# Altium footprint library hphonglib.PcbLib: 1250 footprints (part 17 of 79)
Each footprint in its own frame and in the unit in brackets; x right, y up, seen from the top. Pads: shape width x height; smd on the part's side, far side on the other; paste and mask are expansions set on the pad; w line width, h text height; cw(c..) or ccw(c..) is an arc to the next point about the centre after c.
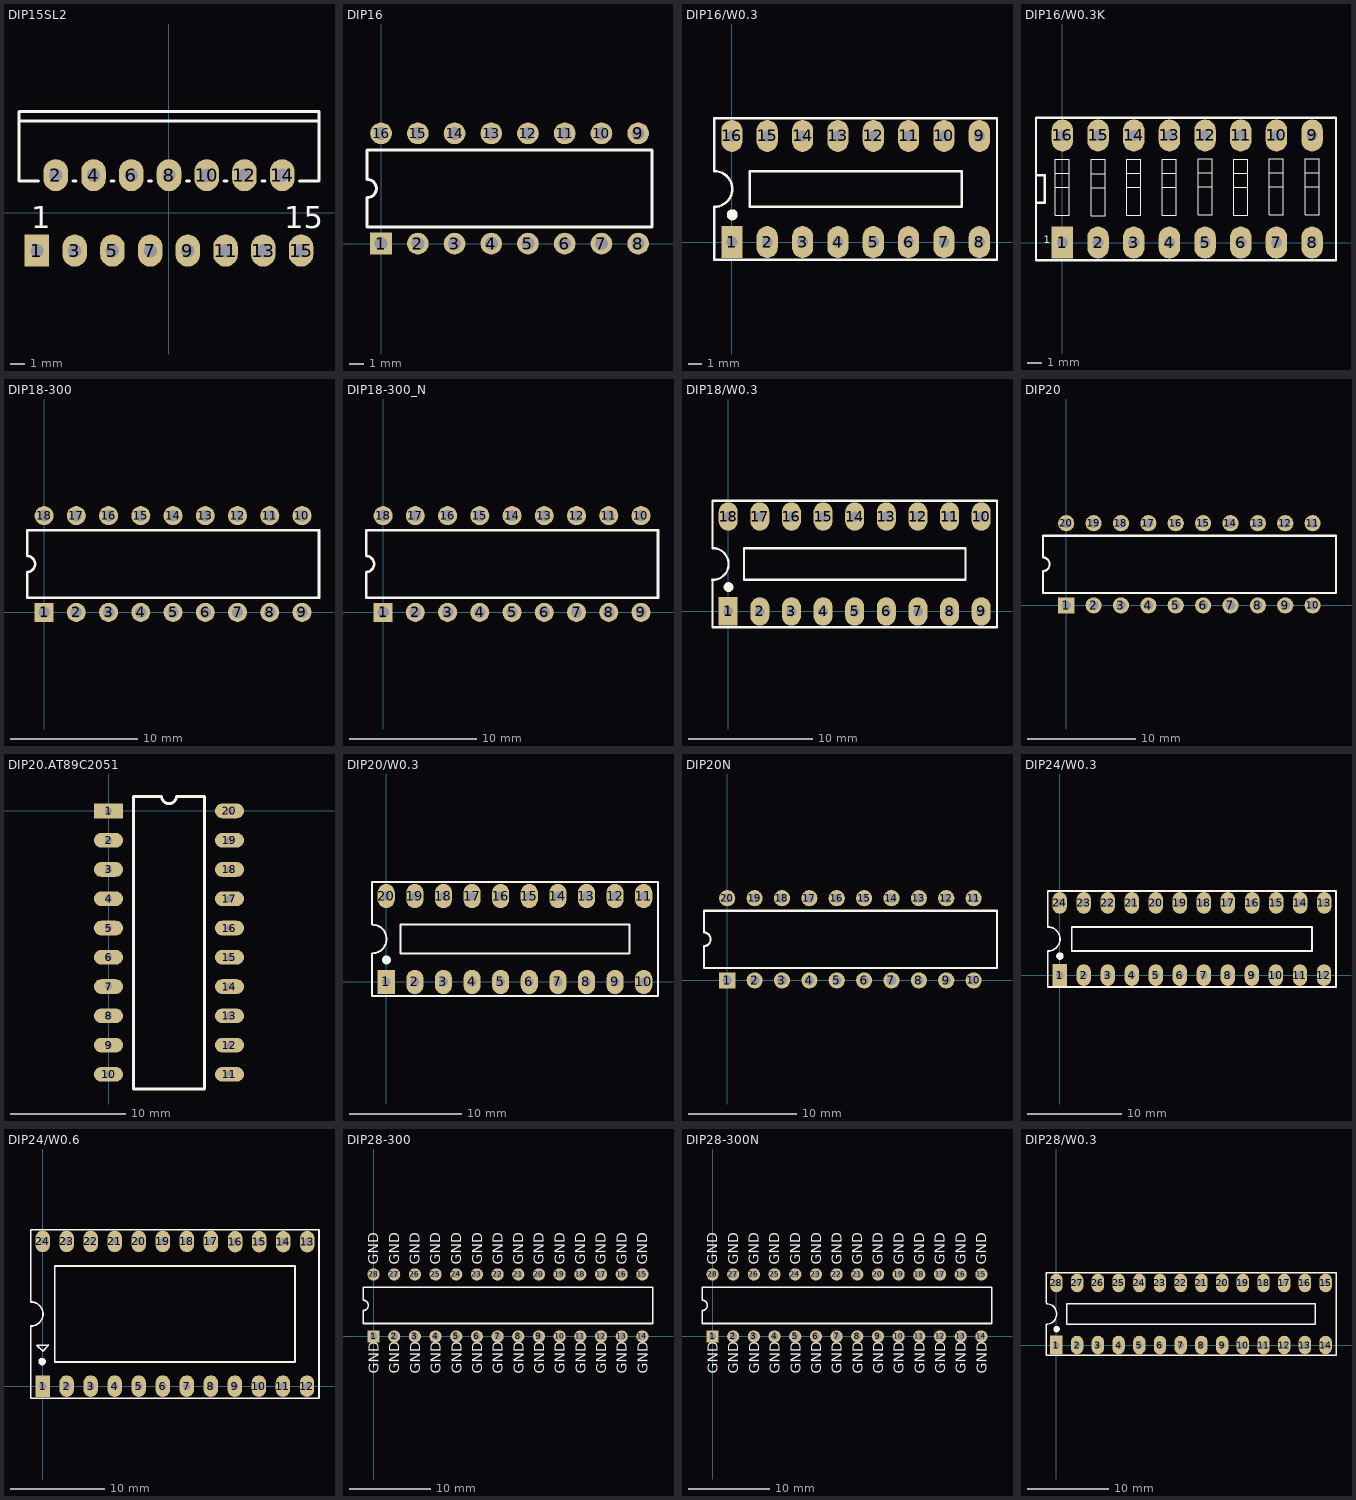
[diagram p16: the footprints below, top view; thin cyan lines are the x and y axes]

## DIP15SL2 [mil] "TO, Thru-Hole, Vertical, Heatsink Mounted; 15 Bent Staggered Leads; Pitch 1.27 mm"
height 826.77
pads (15):
  rect 65x85 hole 35.43: 1(-350,-100)
  oval 65x85 hole 35.43: 2(-300,100) 3(-250,-100) 4(-200,100) 5(-150,-100) 6(-100,100) 7(-50,-100) 8(0,100) 9(50,-100) 10(100,100) 11(150,-100) 12(200,100) 13(250,-100) 14(300,100) 15(350,-100)
Top Overlay:
  lines w7.87: -397.64,243.7 397.64,243.7 ; -346.46,84.25 -397.64,84.25 -397.64,269.29 397.64,269.29 397.64,84.25 346.46,84.25 ; -253.94,84.25 -246.06,84.25 ; -153.94,84.25 -146.06,84.25 ; -53.94,84.25 -46.06,84.25 ; 46.06,84.25 53.94,84.25 ; 146.06,84.25 153.94,84.25 ; 246.06,84.25 253.94,84.25
  text "15" at 305,-40 h59.06
  text "1" at -365,-40 h59.06
3D body "User Library-MULTIWAT T15.step": height 895.25, standoff -85.66, extent -381.82,-109.82 389.84,247.19

## DIP16 [mm] "DIP; 16 Leads; Row Spacing 7.62 mm; Pitch 2.54 mm"
height 4.58
pads (16):
  rect 1.5x1.5 hole 0.9: 1(0,0)
  round 1.5 hole 0.9: 2(2.54,0) 3(5.08,0) 4(7.62,0) 5(10.16,0) 6(12.7,0) 7(15.24,0) 8(17.78,0) 9(17.78,7.62) 10(15.24,7.62) 11(12.7,7.62) 12(10.16,7.62) 13(7.62,7.62) 14(5.08,7.62) 15(2.54,7.62) 16(0,7.62)
Top Overlay:
  lines w0.2: -0.96,1.16 -0.96,3.175 ccw(c-0.96,3.81) -0.96,4.445 -0.96,6.46 18.74,6.46 18.74,1.16 -0.96,1.16
Bottom Overlay:
  lines w0.254: -1.35,-1.175 -1.35,8.725 19.15,8.725 19.15,-1.175 -1.35,-1.175
3D body "DIP16-300.STEP": height 5.08, standoff -2.49, extent -1.15,-0.145 18.85,7.725

## DIP16/W0.3 [mil] "16 PIN, W 300mil, Pin to pin 100mil"
height 100
pads (16):
  rect 60x90 hole 31: 1(0,0)
  oval 60x90 hole 31: 2(100,0) 3(200,0) 4(300,0) 5(400,0) 6(500,0) 7(600,0) 8(700,0) 9(700,300) 10(600,300) 11(500,300) 12(400,300) 13(300,300) 14(200,300) 15(100,300) 16(0,300)
Top Overlay:
  circle w15: c1,77 r8
  lines w7: -50.38,100.05 ccw(c-48.69,150.02) -50,200 ; -50,100 -50,-50 750,-50 750,350 -49,350 -50,349 ; -50,201 -50,350 ; 50,100 650,100 650,200 50,200 50,100
3D body "SW3dPS-DIP 16 _ socket 214.STEP": height 299.42, standoff -131.12, extent -51.7,-57.39 751.7,356

## DIP16/W0.3K [mil] "16 PIN, W 300mil, Pin to pin 100mil For Switch"
height 100
pads (16):
  rect 60x90 hole 31.5: 1(0,0)
  oval 60x90 hole 31.5: 2(100,0) 3(200,0) 4(300,0) 5(400,0) 6(500,0) 7(600,0) 8(700,0) 9(700,300) 10(600,300) 11(500,300) 12(400,300) 13(300,300) 14(200,300) 15(100,300) 16(0,300)
Top Overlay:
  lines w1.5: -19.68,155 19.68,155 ; -19.68,194.37 19.68,194.37 ; 80.31,154 119.69,154 ; 80.31,193.37 119.69,193.37 ; 180.31,155 219.69,155 ; 180.31,194.37 219.69,194.37 ; 280.31,155 319.69,155 ; 280.31,194.37 319.69,194.37 ; 380.31,156 419.69,156 ; 380.31,195.37 419.69,195.37 ; 480.31,155 519.68,155 ; 480.31,194.37 519.68,194.37 ; 580.32,156 619.68,156 ; 580.32,195.37 619.68,195.37 ; 680.32,156 719.68,156 ; 680.32,195.37 719.68,195.37 ; -19.68,76.26 19.68,76.26 19.68,233.74 -19.68,233.74 -19.68,76.26 ; 80.31,75.26 119.69,75.26 119.69,232.74 80.31,232.74 80.31,75.26 ; 180.31,76.26 219.69,76.26 219.69,233.74 180.31,233.74 180.31,76.26 ; 280.31,76.26 319.69,76.26 319.69,233.74 280.31,233.74 280.31,76.26 ; 380.31,77.26 419.69,77.26 419.69,234.74 380.31,234.74 380.31,77.26 ; 480.31,76.26 519.68,76.26 519.68,233.74 480.31,233.74 480.31,76.26 ; 580.32,77.26 619.68,77.26 619.68,234.74 580.32,234.74 580.32,77.26 ; 680.32,77.26 719.68,77.26 719.68,234.74 680.32,234.74 680.32,77.26
  lines w7: -74,69.5 -74,234 ; -74,111 -49,111 -49,189 -73,189 -74,190 ; -74,125 -74,-49 -73,-50 767,-50 767,350 -74,350 -74,175
  text "1" at -52,-2 h20
3D body "SW3dPS-DIP SWITCH 8 POS CTS 206.STEP": height 324.8, standoff -137.8, extent -92.91,-40 792.91,345.04

## DIP18-300 [mm] "DIP, Plastic; 18 Leads; Row Spacing 7.62 mm; Pitch 2.54 mm"
height 4.32
pads (18):
  rect 1.5x1.5 hole 0.9: 1(0,0)
  round 1.5 hole 0.9: 2(2.54,0) 3(5.08,0) 4(7.62,0) 5(10.16,0) 6(12.7,0) 7(15.24,0) 8(17.78,0) 9(20.32,0) 10(20.32,7.62) 11(17.78,7.62) 12(15.24,7.62) 13(12.7,7.62) 14(10.16,7.62) 15(7.62,7.62) 16(5.08,7.62) 17(2.54,7.62) 18(0,7.62)
Top Overlay:
  lines w0.2: -1.34,1.16 21.66,1.16 21.66,6.46 -1.34,6.46 -1.34,4.445 cw(c-1.34,3.81) -1.34,3.175 -1.34,1.16

## DIP18-300_N [mm] "DIP, Plastic; 18 Leads; Row Spacing 7.62 mm; Pitch 2.54 mm"
height 4.32
pads (18):
  rect 1.5x1.5 hole 0.9: 1(0,0)
  round 1.5 hole 0.9: 2(2.54,0) 3(5.08,0) 4(7.62,0) 5(10.16,0) 6(12.7,0) 7(15.24,0) 8(17.78,0) 9(20.32,0) 10(20.32,7.62) 11(17.78,7.62) 12(15.24,7.62) 13(12.7,7.62) 14(10.16,7.62) 15(7.62,7.62) 16(5.08,7.62) 17(2.54,7.62) 18(0,7.62)
Top Overlay:
  lines w0.2: -1.34,1.16 -1.34,3.175 ccw(c-1.34,3.81) -1.34,4.445 -1.34,6.46 21.66,6.46 21.66,1.16 -1.34,1.16

## DIP18/W0.3 [mil] "18 PIN, W 300mil, Pin to pin 100mil"
height 100
pads (18):
  rect 60x90 hole 31: 1(0,0)
  oval 60x90 hole 31: 2(100,0) 3(200,0) 4(300,0) 5(400,0) 6(500,0) 7(600,0) 8(700,0) 9(800,0) 10(800,300) 11(700,300) 12(600,300) 13(500,300) 14(400,300) 15(300,300) 16(200,300) 17(100,300) 18(0,300)
Top Overlay:
  circle w15: c1,77 r8
  lines w7: -50.38,100.05 ccw(c-48.69,150.02) -50,200 ; -50,100 -50,-50 850,-50 850,350 -50,350 -50,201 ; 50,100 750,100 750,200 50,200 50,100
3D body "SW3dPS-DIP18.STEP": height 118.71, standoff -131.12, extent -51.18,-57.39 849.18,356

## DIP20 [mm] "DIP; 20 Leads; Row Spacing 7.62 mm; Pitch 2.54 mm"
height 4.58
pads (20):
  rect 1.5x1.5 hole 0.9: 1(0,0)
  round 1.5 hole 0.9: 2(2.54,0) 3(5.08,0) 4(7.62,0) 5(10.16,0) 6(12.7,0) 7(15.24,0) 8(17.78,0) 9(20.32,0) 10(22.86,0) 11(22.86,7.62) 12(20.32,7.62) 13(17.78,7.62) 14(15.24,7.62) 15(12.7,7.62) 16(10.16,7.62) 17(7.62,7.62) 18(5.08,7.62) 19(2.54,7.62) 20(0,7.62)
Top Overlay:
  lines w0.2: -2.17,1.16 -2.17,3.175 ccw(c-2.17,3.81) -2.17,4.445 -2.17,6.46 25.03,6.46 25.03,1.16 -2.17,1.16
Bottom Overlay:
  lines w0.254: -1.3,-1.15 24.2,-1.15 24.2,8.825 -1.3,8.825 -1.3,-1.15
3D body: height 0.5, standoff -3.8, extent -0.26,-0.195 0.29,0.155
3D body: height 3, standoff 0.5, extent -0.735,-0.195 0.765,0.155
3D body: height 3, standoff 2.65, extent -0.735,-0.02 0.765,1.68
3D body: height 0.5, standoff -3.8, extent 2.28,-0.195 2.83,0.155
3D body: height 3, standoff 0.5, extent 1.805,-0.195 3.305,0.155
3D body: height 3, standoff 2.65, extent 1.805,-0.02 3.305,1.68
3D body: height 0.5, standoff -3.8, extent 4.82,-0.195 5.37,0.155
3D body: height 3, standoff 0.5, extent 4.345,-0.195 5.845,0.155
3D body: height 3, standoff 2.65, extent 4.345,-0.02 5.845,1.68
3D body: height 0.5, standoff -3.8, extent 7.36,-0.195 7.91,0.155
3D body: height 3, standoff 0.5, extent 6.885,-0.195 8.385,0.155
3D body: height 3, standoff 2.65, extent 6.885,-0.02 8.385,1.68
3D body: height 0.5, standoff -3.8, extent 9.9,-0.195 10.45,0.155
3D body: height 3, standoff 0.5, extent 9.425,-0.195 10.925,0.155
3D body: height 3, standoff 2.65, extent 9.425,-0.02 10.925,1.68
3D body: height 0.5, standoff -3.8, extent 12.44,-0.195 12.99,0.155
3D body: height 3, standoff 0.5, extent 11.965,-0.195 13.465,0.155
3D body: height 3, standoff 2.65, extent 11.965,-0.02 13.465,1.68
3D body: height 0.5, standoff -3.8, extent 14.98,-0.195 15.53,0.155
3D body: height 3, standoff 0.5, extent 14.505,-0.195 16.005,0.155
3D body: height 3, standoff 2.65, extent 14.505,-0.02 16.005,1.68
3D body: height 0.5, standoff -3.8, extent 17.52,-0.195 18.07,0.155
3D body: height 3, standoff 0.5, extent 17.045,-0.195 18.545,0.155
3D body: height 3, standoff 2.65, extent 17.045,-0.02 18.545,1.68
3D body: height 0.5, standoff -3.8, extent 20.06,-0.195 20.61,0.155
3D body: height 3, standoff 0.5, extent 19.585,-0.195 21.085,0.155
3D body: height 3, standoff 2.65, extent 19.585,-0.02 21.085,1.68
3D body: height 0.5, standoff -3.8, extent 22.6,-0.195 23.15,0.155
3D body: height 3, standoff 0.5, extent 22.125,-0.195 23.625,0.155
3D body: height 3, standoff 2.65, extent 22.125,-0.02 23.625,1.68
3D body: height 3, standoff 2.65, extent -0.765,5.94 0.735,7.64
3D body: height 3, standoff 0.5, extent -0.765,7.465 0.735,7.815
3D body: height 0.5, standoff -3.8, extent -0.29,7.465 0.26,7.815
3D body: height 3, standoff 2.65, extent 1.775,5.94 3.275,7.64
3D body: height 3, standoff 0.5, extent 1.775,7.465 3.275,7.815
3D body: height 0.5, standoff -3.8, extent 2.25,7.465 2.8,7.815
3D body: height 3, standoff 2.65, extent 4.315,5.94 5.815,7.64
3D body: height 3, standoff 0.5, extent 4.315,7.465 5.815,7.815
3D body: height 0.5, standoff -3.8, extent 4.79,7.465 5.34,7.815
3D body: height 3, standoff 2.65, extent 6.855,5.94 8.355,7.64
3D body: height 3, standoff 0.5, extent 6.855,7.465 8.355,7.815
3D body: height 0.5, standoff -3.8, extent 7.33,7.465 7.88,7.815
3D body: height 3, standoff 2.65, extent 9.395,5.94 10.895,7.64
3D body: height 3, standoff 0.5, extent 9.395,7.465 10.895,7.815
3D body: height 0.5, standoff -3.8, extent 9.87,7.465 10.42,7.815
3D body: height 3, standoff 2.65, extent 11.935,5.94 13.435,7.64
3D body: height 3, standoff 0.5, extent 11.935,7.465 13.435,7.815
3D body: height 0.5, standoff -3.8, extent 12.41,7.465 12.96,7.815
3D body: height 3, standoff 2.65, extent 14.475,5.94 15.975,7.64
3D body: height 3, standoff 0.5, extent 14.475,7.465 15.975,7.815
3D body: height 0.5, standoff -3.8, extent 14.95,7.465 15.5,7.815
3D body: height 3, standoff 2.65, extent 17.015,5.94 18.515,7.64
3D body: height 3, standoff 0.5, extent 17.015,7.465 18.515,7.815
3D body: height 0.5, standoff -3.8, extent 17.49,7.465 18.04,7.815
3D body: height 3, standoff 2.65, extent 19.555,5.94 21.055,7.64
3D body: height 3, standoff 0.5, extent 19.555,7.465 21.055,7.815
3D body: height 0.5, standoff -3.8, extent 20.03,7.465 20.58,7.815
3D body: height 3, standoff 2.65, extent 22.095,5.94 23.595,7.64
3D body: height 3, standoff 0.5, extent 22.095,7.465 23.595,7.815
3D body: height 0.5, standoff -3.8, extent 22.57,7.465 23.12,7.815
3D body: height 5.3, standoff 0.3, extent -1.295,1.255 24.105,6.335
3D body: height 5.4, standoff 4, extent -1.295,2.799 -0.295,4.799

## DIP20.AT89C2051 [mm]
pads (20):
  rect 2.54x1.27 hole 0.635: 1(0,0)
  oval 2.54x1.27 hole 0.635: 2(0,-2.54) 3(0,-5.08) 4(0,-7.62) 5(0,-10.16) 6(0,-12.7) 7(0,-15.24) 8(0,-17.78) 9(0,-20.32) 10(0,-22.86) 11(10.5,-22.86) 12(10.5,-20.32) 13(10.5,-17.78) 14(10.5,-15.24) 15(10.5,-12.7) 16(10.5,-10.16) 17(10.5,-7.62) 18(10.5,-5.08) 19(10.5,-2.54) 20(10.5,0)
Top Overlay:
  lines w0.254: 2.159,-24.13 2.159,1.27 4.615,1.27 ccw(c5.25,1.27) 5.885,1.27 8.341,1.27 8.341,-24.13 2.159,-24.13
3D body: height 5.3, standoff 0.3, extent 1.7,-25.025 8.8,1.975
3D body: height 3, standoff 2.65, extent 0,-0.75 1.7,0.75
3D body: height 3, standoff 0.5, extent -0.175,-0.75 0.175,0.75
3D body: height 0.5, standoff -3.8, extent -0.175,-0.275 0.175,0.275
3D body: height 0.5, standoff -3.8, extent -0.175,-2.815 0.175,-2.265
3D body: height 3, standoff 0.5, extent -0.175,-3.29 0.175,-1.79
3D body: height 3, standoff 2.65, extent 0,-3.29 1.7,-1.79
3D body: height 0.5, standoff -3.8, extent -0.175,-5.355 0.175,-4.805
3D body: height 3, standoff 0.5, extent -0.175,-5.83 0.175,-4.33
3D body: height 3, standoff 2.65, extent 0,-5.83 1.7,-4.33
3D body: height 0.5, standoff -3.8, extent -0.175,-7.895 0.175,-7.345
3D body: height 3, standoff 0.5, extent -0.175,-8.37 0.175,-6.87
3D body: height 3, standoff 2.65, extent 0,-8.37 1.7,-6.87
3D body: height 0.5, standoff -3.8, extent -0.175,-10.435 0.175,-9.885
3D body: height 3, standoff 0.5, extent -0.175,-10.91 0.175,-9.41
3D body: height 3, standoff 2.65, extent 0,-10.91 1.7,-9.41
3D body: height 0.5, standoff -3.8, extent -0.175,-12.975 0.175,-12.425
3D body: height 3, standoff 0.5, extent -0.175,-13.45 0.175,-11.95
3D body: height 3, standoff 2.65, extent 0,-13.45 1.7,-11.95
3D body: height 0.5, standoff -3.8, extent -0.175,-15.515 0.175,-14.965
3D body: height 3, standoff 0.5, extent -0.175,-15.99 0.175,-14.49
3D body: height 3, standoff 2.65, extent 0,-15.99 1.7,-14.49
3D body: height 0.5, standoff -3.8, extent -0.175,-18.055 0.175,-17.505
3D body: height 3, standoff 0.5, extent -0.175,-18.53 0.175,-17.03
3D body: height 3, standoff 2.65, extent 0,-18.53 1.7,-17.03
3D body: height 0.5, standoff -3.8, extent -0.175,-20.595 0.175,-20.045
3D body: height 3, standoff 0.5, extent -0.175,-21.07 0.175,-19.57
3D body: height 3, standoff 2.65, extent 0,-21.07 1.7,-19.57
3D body: height 0.5, standoff -3.8, extent -0.175,-23.135 0.175,-22.585
3D body: height 3, standoff 0.5, extent -0.175,-23.61 0.175,-22.11
3D body: height 3, standoff 2.65, extent 0,-23.61 1.7,-22.11
3D body: height 0.5, standoff -3.8, extent 10.325,-23.135 10.675,-22.585
3D body: height 3, standoff 0.5, extent 10.325,-23.61 10.675,-22.11
3D body: height 3, standoff 2.65, extent 8.8,-23.61 10.5,-22.11
3D body: height 0.5, standoff -3.8, extent 10.325,-20.595 10.675,-20.045
3D body: height 3, standoff 0.5, extent 10.325,-21.07 10.675,-19.57
3D body: height 3, standoff 2.65, extent 8.8,-21.07 10.5,-19.57
3D body: height 0.5, standoff -3.8, extent 10.325,-18.055 10.675,-17.505
3D body: height 3, standoff 0.5, extent 10.325,-18.53 10.675,-17.03
3D body: height 3, standoff 2.65, extent 8.8,-18.53 10.5,-17.03
3D body: height 0.5, standoff -3.8, extent 10.325,-15.515 10.675,-14.965
3D body: height 3, standoff 0.5, extent 10.325,-15.99 10.675,-14.49
3D body: height 3, standoff 2.65, extent 8.8,-15.99 10.5,-14.49
3D body: height 0.5, standoff -3.8, extent 10.325,-12.975 10.675,-12.425
3D body: height 3, standoff 0.5, extent 10.325,-13.45 10.675,-11.95
3D body: height 3, standoff 2.65, extent 8.8,-13.45 10.5,-11.95
3D body: height 0.5, standoff -3.8, extent 10.325,-10.435 10.675,-9.885
3D body: height 3, standoff 0.5, extent 10.325,-10.91 10.675,-9.41
3D body: height 3, standoff 2.65, extent 8.8,-10.91 10.5,-9.41
3D body: height 0.5, standoff -3.8, extent 10.325,-7.895 10.675,-7.345
3D body: height 3, standoff 0.5, extent 10.325,-8.37 10.675,-6.87
3D body: height 3, standoff 2.65, extent 8.8,-8.37 10.5,-6.87
3D body: height 0.5, standoff -3.8, extent 10.325,-5.355 10.675,-4.805
3D body: height 3, standoff 0.5, extent 10.325,-5.83 10.675,-4.33
3D body: height 3, standoff 2.65, extent 8.8,-5.83 10.5,-4.33
3D body: height 0.5, standoff -3.8, extent 10.325,-2.815 10.675,-2.265
3D body: height 3, standoff 0.5, extent 10.325,-3.29 10.675,-1.79
3D body: height 3, standoff 2.65, extent 8.8,-3.29 10.5,-1.79
3D body: height 0.5, standoff -3.8, extent 10.325,-0.275 10.675,0.275
3D body: height 3, standoff 0.5, extent 10.325,-0.75 10.675,0.75
3D body: height 3, standoff 2.65, extent 8.8,-0.75 10.5,0.75
3D body: height 5.4, standoff 4, extent 4.254,1 6.254,2
3D body: height 5.3, standoff 5.29, extent 5.925,-2.5 7.175,-1.675
3D body: height 5.3, standoff 5.29, extent 5.925,-6.025 7.6,-2.228
3D body: height 5.3, standoff 5.29, extent 5.925,-4.1 7.175,-3
3D body: height 5.3, standoff 5.29, extent 5.925,-5.107 7.175,-4.25
3D body: height 5.3, standoff 5.29, extent 5.925,-6 7.175,-5.25
3D body: height 5.3, standoff 5.29, extent 5.525,-5.8 5.825,-1.675

## DIP20/W0.3 [mil] "DIP 20, 20 PIN, W 300mil, Pin to pin 100mil"
height 100
pads (20):
  rect 60x85 hole 31: 1(0,0)
  oval 60x85 hole 31: 2(100,0) 3(200,0) 4(300,0) 5(400,0) 6(500,0) 7(600,0) 8(700,0) 9(800,0) 10(900,0) 11(900,300) 12(800,300) 13(700,300) 14(600,300) 15(500,300) 16(400,300) 17(300,300) 18(200,300) 19(100,300) 20(0,300)
Top Overlay:
  circle w15: c1,77 r8
  lines w7: -50.38,100.05 ccw(c-48.69,150.02) -50,200 ; -50,100 -50,-50 950,-50 950,350 -50,350 -50,201 ; 50,100 850,100 850,200 50,200 50,100
3D body "User Library-20-pin-dip.STEP": height 155, standoff -130, extent -91,-18 945,322

## DIP20N [mm] "DIP; 20 Leads; Row Spacing 7.62 mm; Pitch 2.54 mm"
height 4.58
pads (20):
  rect 1.5x1.5 hole 0.9: 1(0,0)
  round 1.5 hole 0.9: 2(2.54,0) 3(5.08,0) 4(7.62,0) 5(10.16,0) 6(12.7,0) 7(15.24,0) 8(17.78,0) 9(20.32,0) 10(22.86,0) 11(22.86,7.62) 12(20.32,7.62) 13(17.78,7.62) 14(15.24,7.62) 15(12.7,7.62) 16(10.16,7.62) 17(7.62,7.62) 18(5.08,7.62) 19(2.54,7.62) 20(0,7.62)
Top Overlay:
  lines w0.2: -2.17,1.16 -2.17,3.175 ccw(c-2.17,3.81) -2.17,4.445 -2.17,6.46 25.03,6.46 25.03,1.16 -2.17,1.16
Bottom Overlay:
  lines w0.254: -1.65,-1.15 24.45,-1.15 24.45,8.825 -1.65,8.825 -1.65,-1.15
3D body "DIP20-300.STEP": height 4.65, standoff -1.57, extent -1.525,-0.137 24.256,7.737

## DIP24/W0.3 [mil] "DIP24/W.300, Pin to pin 100mil"
height 100
pads (24):
  rect 60x90 hole 31: 1(0,0)
  oval 60x90 hole 31: 2(100,0) 3(200,0) 4(300,0) 5(400,0) 6(500,0) 7(600,0) 8(700,0) 9(800,0) 10(900,0) 11(1000,0) 12(1100,0) 13(1101,300) 14(1001,300) 15(901,300) 16(801,300) 17(700,300) 18(600,300) 19(500,300) 20(400,300) 21(300,300) 22(200,300) 23(100,300) 24(0,300)
Top Overlay:
  circle w15: c1,79 r8
  lines w7: -50.38,100.05 ccw(c-48.69,150.02) -50,200 ; -50,100 -50,-50 1150,-50 1150,350 -50,350 -50,201 ; 50,100 50,200 1050,200 1050,100 50,100
3D body "SW3dPS-DIP24-300.STEP": height 200, standoff -98.03, extent -89.04,-2.92 1181.04,306.92

## DIP24/W0.6 [mil] "DIP24/W.600, Pin to pin 100mil"
height 100
pads (24):
  rect 60x90 hole 31: 1(0,0)
  oval 60x90 hole 31: 2(100,0) 3(200,0) 4(300,0) 5(400,0) 6(500,0) 7(600,0) 8(700,0) 9(800,0) 10(900,0) 11(1000,0) 12(1100,0) 13(1101,601) 14(1001,601) 15(901,601) 16(801,601) 17(700,602) 18(600,602) 19(500,602) 20(400,602) 21(300,602) 22(200,602) 23(100,602) 24(0,602)
Top Overlay:
  circle w15: c-2,102 r8
  lines w7: -50,350 -50,650 1150,650 1150,-50 -50,-50 -50,250 ccw(c-48.31,299.97) -49.62,349.95 ; -25,170 23,170 24,171 24,169 0,145 0,146 -24,170 -25,170 ; 50,100 50,500 1050,500 1050,100 50,100
3D body "SW3DPS-DIP 24 IC WITH 0_280IN WINDOW-DEFAULT.STEP": height 227.95, standoff -129.92, extent -82.52,0.16 1202.52,600

## DIP28-300 [mm] "DIP, Plastic, Skinny; 28 Leads; Row Spacing 7.62 mm; Pitch 2.54 mm"
height 4.07
pads (28):
  rect 1.5x1.5 hole 0.9: 1(0,0)
  round 1.5 hole 0.9: 2(2.54,0) 3(5.08,0) 4(7.62,0) 5(10.16,0) 6(12.7,0) 7(15.24,0) 8(17.78,0) 9(20.32,0) 10(22.86,0) 11(25.4,0) 12(27.94,0) 13(30.48,0) 14(33.02,0) 15(33.02,7.62) 16(30.48,7.62) 17(27.94,7.62) 18(25.4,7.62) 19(22.86,7.62) 20(20.32,7.62) 21(17.78,7.62) 22(15.24,7.62) 23(12.7,7.62) 24(10.16,7.62) 25(7.62,7.62) 26(5.08,7.62) 27(2.54,7.62) 28(0,7.62)
Top Overlay:
  lines w0.2: -1.27,1.585 34.29,1.585 34.29,6.035 -1.27,6.035 -1.27,4.445 cw(c-1.27,3.81) -1.27,3.175 -1.27,1.585
  text "GND" at 15.845,8.8 h1.27
  text "GND" at 13.33,8.78 h1.27
  text "GND" at 10.765,8.8 h1.27
  text "GND" at 8.225,8.8 h1.27
  text "GND" at 5.685,8.8 h1.27
  text "GND" at 3.145,8.8 h1.27
  text "GND" at 0.605,8.8 h1.27
  text "GND" at 18.385,8.8 h1.27
  text "GND" at 20.925,8.8 h1.27
  text "GND" at 23.465,8.8 h1.27
  text "GND" at 26.005,8.8 h1.27
  text "GND" at 28.545,8.8 h1.27
  text "GND" at 31.085,8.8 h1.27
  text "GND" at 31.13,-4.565 h1.27
  text "GND" at 33.67,-4.565 h1.27
  text "GND" at 33.625,8.8 h1.27
  text "GND" at 23.51,-4.565 h1.27
  text "GND" at 26.05,-4.565 h1.27
  text "GND" at 28.59,-4.565 h1.27
  text "GND" at 15.89,-4.565 h1.27
  text "GND" at 18.43,-4.565 h1.27
  text "GND" at 20.97,-4.565 h1.27
  text "GND" at 8.27,-4.565 h1.27
  text "GND" at 10.81,-4.565 h1.27
  text "GND" at 13.35,-4.565 h1.27
  text "GND" at 5.73,-4.565 h1.27
  text "GND" at 3.19,-4.565 h1.27
  text "GND" at 0.65,-4.565 h1.27
Bottom Overlay:
  lines w0.254: -1.35,-1.075 34.4,-1.075 34.4,8.8 -1.35,8.8 -1.35,-1.075
  text "GND" at -0.585,-4.85 h1.27
  text "GND" at 1.955,-4.85 h1.27
  text "GND" at 4.495,-4.85 h1.27
  text "GND" at 7.035,-4.85 h1.27
  text "GND" at 9.575,-4.85 h1.27
  text "GND" at 12.115,-4.85 h1.27
  text "GND" at 14.655,-4.85 h1.27
  text "GND" at 17.195,-4.85 h1.27
  text "GND" at 19.735,-4.85 h1.27
  text "GND" at 22.275,-4.85 h1.27
  text "GND" at 24.815,-4.85 h1.27
  text "GND" at 27.355,-4.85 h1.27
  text "GND" at 29.835,-4.875 h1.27
  text "GND" at 32.375,-4.875 h1.27
  text "GND" at 33.65,12.7 h1.27
  text "GND" at 31.11,12.7 h1.27
  text "GND" at 28.57,12.7 h1.27
  text "GND" at 20.95,12.7 h1.27
  text "GND" at 23.49,12.7 h1.27
  text "GND" at 26.03,12.7 h1.27
  text "GND" at 13.33,12.7 h1.27
  text "GND" at 15.87,12.7 h1.27
  text "GND" at 18.41,12.7 h1.27
  text "GND" at 5.71,12.7 h1.27
  text "GND" at 8.25,12.7 h1.27
  text "GND" at 10.79,12.7 h1.27
  text "GND" at 0.63,12.7 h1.27
  text "GND" at 3.17,12.7 h1.27
3D body: height 5.3, standoff 0.3, extent -1.245,1.305 34.325,6.385
3D body: height 3, standoff 0.5, extent 1.775,7.455 3.275,7.805
3D body: height 3, standoff 2.65, extent 1.775,6.375 3.275,7.625
3D body: height 0.5, standoff -3.8, extent 2.275,7.45 2.825,7.8
3D body: height 0.5, standoff -3.8, extent -0.265,7.45 0.285,7.8
3D body: height 3, standoff 2.65, extent -0.765,6.375 0.735,7.625
3D body: height 3, standoff 0.5, extent -0.765,7.455 0.735,7.805
3D body: height 3, standoff 0.5, extent 4.315,7.455 5.815,7.805
3D body: height 3, standoff 2.65, extent 4.315,6.375 5.815,7.625
3D body: height 0.5, standoff -3.8, extent 4.815,7.45 5.365,7.8
3D body: height 3, standoff 0.5, extent 6.855,7.455 8.355,7.805
3D body: height 3, standoff 2.65, extent 6.855,6.375 8.355,7.625
3D body: height 0.5, standoff -3.8, extent 7.355,7.45 7.905,7.8
3D body: height 3, standoff 0.5, extent 9.395,7.455 10.895,7.805
3D body: height 3, standoff 2.65, extent 9.395,6.375 10.895,7.625
3D body: height 0.5, standoff -3.8, extent 9.895,7.45 10.445,7.8
3D body: height 3, standoff 0.5, extent 11.935,7.455 13.435,7.805
3D body: height 3, standoff 2.65, extent 11.935,6.375 13.435,7.625
3D body: height 0.5, standoff -3.8, extent 12.435,7.45 12.985,7.8
3D body: height 3, standoff 0.5, extent 14.475,7.455 15.975,7.805
3D body: height 3, standoff 2.65, extent 14.475,6.375 15.975,7.625
3D body: height 0.5, standoff -3.8, extent 14.975,7.45 15.525,7.8
3D body: height 3, standoff 0.5, extent 17.015,7.455 18.515,7.805
3D body: height 3, standoff 2.65, extent 17.015,6.375 18.515,7.625
3D body: height 0.5, standoff -3.8, extent 17.515,7.45 18.065,7.8
3D body: height 3, standoff 0.5, extent 19.555,7.455 21.055,7.805
3D body: height 3, standoff 2.65, extent 19.555,6.375 21.055,7.625
3D body: height 0.5, standoff -3.8, extent 20.055,7.45 20.605,7.8
3D body: height 3, standoff 0.5, extent 22.095,7.455 23.595,7.805
3D body: height 3, standoff 2.65, extent 22.095,6.375 23.595,7.625
3D body: height 0.5, standoff -3.8, extent 22.595,7.45 23.145,7.8
3D body: height 3, standoff 0.5, extent 24.635,7.455 26.135,7.805
3D body: height 3, standoff 2.65, extent 24.635,6.375 26.135,7.625
3D body: height 0.5, standoff -3.8, extent 25.135,7.45 25.685,7.8
3D body: height 3, standoff 0.5, extent 27.175,7.455 28.675,7.805
3D body: height 3, standoff 2.65, extent 27.175,6.375 28.675,7.625
3D body: height 0.5, standoff -3.8, extent 27.675,7.45 28.225,7.8
3D body: height 3, standoff 0.5, extent 29.715,7.455 31.215,7.805
3D body: height 3, standoff 2.65, extent 29.715,6.375 31.215,7.625
3D body: height 0.5, standoff -3.8, extent 30.215,7.45 30.765,7.8
3D body: height 3, standoff 0.5, extent 32.255,7.455 33.755,7.805
3D body: height 3, standoff 2.65, extent 32.255,6.375 33.755,7.625
3D body: height 0.5, standoff -3.8, extent 32.755,7.45 33.305,7.8
3D body: height 3, standoff 0.5, extent 32.285,-0.185 33.785,0.165
3D body: height 3, standoff 2.65, extent 32.285,-0.005 33.785,1.245
3D body: height 0.5, standoff -3.8, extent 32.735,-0.18 33.285,0.17
3D body: height 3, standoff 0.5, extent 29.745,-0.185 31.245,0.165
3D body: height 3, standoff 2.65, extent 29.745,-0.005 31.245,1.245
3D body: height 0.5, standoff -3.8, extent 30.195,-0.18 30.745,0.17
3D body: height 3, standoff 0.5, extent 27.205,-0.185 28.705,0.165
3D body: height 3, standoff 2.65, extent 27.205,-0.005 28.705,1.245
3D body: height 0.5, standoff -3.8, extent 27.655,-0.18 28.205,0.17
3D body: height 3, standoff 0.5, extent 24.665,-0.185 26.165,0.165
3D body: height 3, standoff 2.65, extent 24.665,-0.005 26.165,1.245
3D body: height 0.5, standoff -3.8, extent 25.115,-0.18 25.665,0.17
3D body: height 3, standoff 0.5, extent 22.125,-0.185 23.625,0.165
3D body: height 3, standoff 2.65, extent 22.125,-0.005 23.625,1.245
3D body: height 0.5, standoff -3.8, extent 22.575,-0.18 23.125,0.17
3D body: height 3, standoff 0.5, extent 19.585,-0.185 21.085,0.165
3D body: height 3, standoff 2.65, extent 19.585,-0.005 21.085,1.245
3D body: height 0.5, standoff -3.8, extent 20.035,-0.18 20.585,0.17
3D body: height 3, standoff 0.5, extent 17.045,-0.185 18.545,0.165
3D body: height 3, standoff 2.65, extent 17.045,-0.005 18.545,1.245
3D body: height 0.5, standoff -3.8, extent 17.495,-0.18 18.045,0.17
3D body: height 3, standoff 0.5, extent 14.505,-0.185 16.005,0.165
3D body: height 3, standoff 2.65, extent 14.505,-0.005 16.005,1.245
3D body: height 0.5, standoff -3.8, extent 14.955,-0.18 15.505,0.17
3D body: height 3, standoff 0.5, extent 11.965,-0.185 13.465,0.165
3D body: height 3, standoff 2.65, extent 11.965,-0.005 13.465,1.245
3D body: height 0.5, standoff -3.8, extent 12.415,-0.18 12.965,0.17
3D body: height 3, standoff 0.5, extent 9.425,-0.185 10.925,0.165
3D body: height 3, standoff 2.65, extent 9.425,-0.005 10.925,1.245
3D body: height 0.5, standoff -3.8, extent 9.875,-0.18 10.425,0.17
3D body: height 3, standoff 0.5, extent 6.885,-0.185 8.385,0.165
3D body: height 3, standoff 2.65, extent 6.885,-0.005 8.385,1.245
3D body: height 0.5, standoff -3.8, extent 7.335,-0.18 7.885,0.17
3D body: height 3, standoff 0.5, extent 4.345,-0.185 5.845,0.165
3D body: height 3, standoff 2.65, extent 4.345,-0.005 5.845,1.245
3D body: height 0.5, standoff -3.8, extent 4.795,-0.18 5.345,0.17
3D body: height 3, standoff 0.5, extent -0.735,-0.185 0.765,0.165
3D body: height 3, standoff 2.65, extent -0.735,-0.005 0.765,1.245
3D body: height 0.5, standoff -3.8, extent -0.285,-0.18 0.265,0.17
3D body: height 3, standoff 0.5, extent 1.805,-0.185 3.305,0.165
3D body: height 3, standoff 2.65, extent 1.805,-0.005 3.305,1.245
3D body: height 0.5, standoff -3.8, extent 2.255,-0.18 2.805,0.17
3D body: height 5.4, standoff 4, extent -1.245,2.849 -0.245,4.849

## DIP28-300N [mm] "DIP, Plastic, Skinny; 28 Leads; Row Spacing 7.62 mm; Pitch 2.54 mm"
height 4.07
pads (28):
  rect 1.5x1.5 hole 0.9: 1(0,0)
  round 1.5 hole 0.9: 2(2.54,0) 3(5.08,0) 4(7.62,0) 5(10.16,0) 6(12.7,0) 7(15.24,0) 8(17.78,0) 9(20.32,0) 10(22.86,0) 11(25.4,0) 12(27.94,0) 13(30.48,0) 14(33.02,0) 15(33.02,7.62) 16(30.48,7.62) 17(27.94,7.62) 18(25.4,7.62) 19(22.86,7.62) 20(20.32,7.62) 21(17.78,7.62) 22(15.24,7.62) 23(12.7,7.62) 24(10.16,7.62) 25(7.62,7.62) 26(5.08,7.62) 27(2.54,7.62) 28(0,7.62)
Top Overlay:
  lines w0.2: -1.27,1.585 34.29,1.585 34.29,6.035 -1.27,6.035 -1.27,4.445 cw(c-1.27,3.81) -1.27,3.175 -1.27,1.585
  text "GND" at 0.65,-4.565 h1.27
  text "GND" at 3.19,-4.565 h1.27
  text "GND" at 5.73,-4.565 h1.27
  text "GND" at 13.35,-4.565 h1.27
  text "GND" at 10.81,-4.565 h1.27
  text "GND" at 8.27,-4.565 h1.27
  text "GND" at 20.97,-4.565 h1.27
  text "GND" at 18.43,-4.565 h1.27
  text "GND" at 15.89,-4.565 h1.27
  text "GND" at 28.59,-4.565 h1.27
  text "GND" at 26.05,-4.565 h1.27
  text "GND" at 23.51,-4.565 h1.27
  text "GND" at 33.625,8.8 h1.27
  text "GND" at 33.67,-4.565 h1.27
  text "GND" at 31.13,-4.565 h1.27
  text "GND" at 31.085,8.8 h1.27
  text "GND" at 28.545,8.8 h1.27
  text "GND" at 26.005,8.8 h1.27
  text "GND" at 23.465,8.8 h1.27
  text "GND" at 20.925,8.8 h1.27
  text "GND" at 18.385,8.8 h1.27
  text "GND" at 0.605,8.8 h1.27
  text "GND" at 3.145,8.8 h1.27
  text "GND" at 5.685,8.8 h1.27
  text "GND" at 8.225,8.8 h1.27
  text "GND" at 10.765,8.8 h1.27
  text "GND" at 13.33,8.78 h1.27
  text "GND" at 15.845,8.8 h1.27
Bottom Overlay:
  lines w0.254: -1.35,-1.075 -1.35,8.8 34.4,8.8 34.4,-1.075 -1.35,-1.075
  text "GND" at 3.17,12.7 h1.27
  text "GND" at 0.63,12.7 h1.27
  text "GND" at 10.79,12.7 h1.27
  text "GND" at 8.25,12.7 h1.27
  text "GND" at 5.71,12.7 h1.27
  text "GND" at 18.41,12.7 h1.27
  text "GND" at 15.87,12.7 h1.27
  text "GND" at 13.33,12.7 h1.27
  text "GND" at 26.03,12.7 h1.27
  text "GND" at 23.49,12.7 h1.27
  text "GND" at 20.95,12.7 h1.27
  text "GND" at 28.57,12.7 h1.27
  text "GND" at 31.11,12.7 h1.27
  text "GND" at 33.65,12.7 h1.27
  text "GND" at 32.375,-4.875 h1.27
  text "GND" at 29.835,-4.875 h1.27
  text "GND" at 27.355,-4.85 h1.27
  text "GND" at 24.815,-4.85 h1.27
  text "GND" at 22.275,-4.85 h1.27
  text "GND" at 19.735,-4.85 h1.27
  text "GND" at 17.195,-4.85 h1.27
  text "GND" at 14.655,-4.85 h1.27
  text "GND" at 12.115,-4.85 h1.27
  text "GND" at 9.575,-4.85 h1.27
  text "GND" at 7.035,-4.85 h1.27
  text "GND" at 4.495,-4.85 h1.27
  text "GND" at 1.955,-4.85 h1.27
  text "GND" at -0.585,-4.85 h1.27
3D body "28 pin dip.STEP": height 3.65, standoff -2.57, extent -1.45,0.025 34.491,7.899

## DIP28/W0.3 [mil] "28 PIN, W 300mil, Pin to pin 100mil"
height 100
pads (28):
  rect 60x90 hole 31: 1(0,0)
  oval 60x90 hole 31: 2(100,0) 3(200,0) 4(300,0) 5(400,0) 6(500,0) 7(600,0) 8(700,0) 9(800,0) 10(900,0) 11(1000,0) 12(1100,0) 13(1200,0) 14(1300,0) 15(1300,300) 16(1200,300) 17(1100,300) 18(1000,300) 19(900,300) 20(800,300) 21(700,300) 22(600,300) 23(500,300) 24(400,300) 25(300,300) 26(200,300) 27(100,300) 28(0,300)
Top Overlay:
  circle w15: c1,77 r8
  lines w7: -50.38,100.05 ccw(c-48.69,150.02) -50,200 ; -50,100 -50,-50 1350,-50 1350,350 -50,350 -50,201 ; 50,100 50,200 1250,200 1250,100 50,100
3D body "SW3dPS-DIP28-300.STEP": height 200, standoff -98.03, extent -50,-10 1367.32,299.84